# Altium footprint library SMT.PcbLib: 379 footprints (part 1 of 24)
Each footprint in its own frame and in the unit in brackets; x right, y up, seen from the top. Pads: shape width x height; smd on the part's side, far side on the other; paste and mask are expansions set on the pad; w line width, h text height; cw(c..) or ccw(c..) is an arc to the next point about the centre after c.
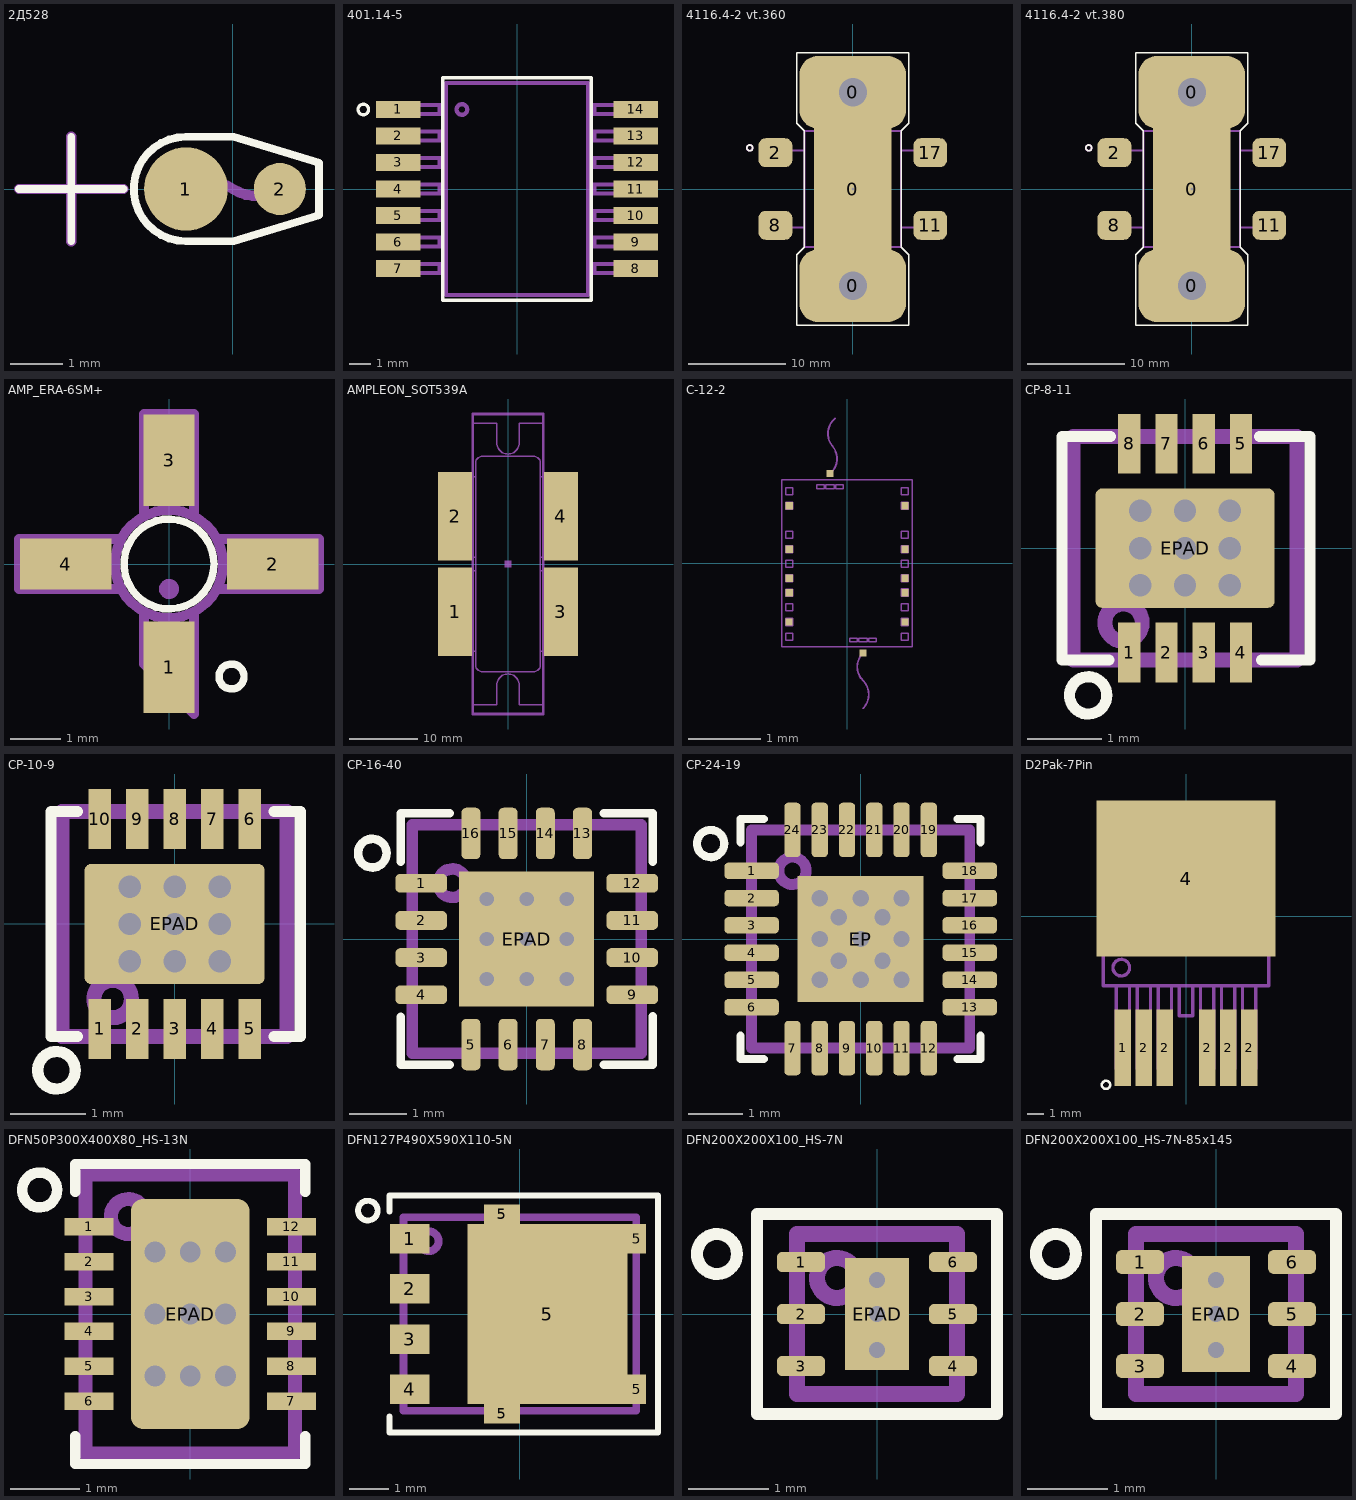
[diagram p0: the footprints below, top view; thin cyan lines are the x and y axes]

## 2Д528 [mm] "Диод кремниевый эпитально-планарный в металлокерамическом корпусе с жесткими выводами"
height 1.2
pads (2):
  round 1.6 smd: 1(-0.9,0)
  round 1 smd: 2(0.9,0)
Top Overlay:
  lines w0.15: -4.1,0 -2.1,0 ; -3.1,-1 -3.1,1 ; -0.9,-1 cw(c-0.9,0) -0.9,1 0.01,1 1.65,0.5 1.65,-0.5 0.01,-1 -0.9,-1
Mechanical 1:
  circle w0.2: c0.9,0 r0.15
  lines w0.2: -4.1,0 -2.1,0 ; -3.1,-1 -3.1,1 ; -0.898,0 cw(c-0.448,-0.7) 0.001,0 ccw(c0.451,0.7) 0.9,0
3D body "Диод 2Д528 _ аА0.339.207 ТУ.stp": height 1.58, standoff 0, extent -1.547,-0.649 0.998,0.649

## 401.14-5 [mm] "Установка по ГОСТ 29137 вариант 381.18.1102.12.00"
height 2.7
pads (14):
  rect 2.1x0.8 smd: 1(-5.6,3.75) 2(-5.6,2.5) 3(-5.6,1.25) 4(-5.6,0) 5(-5.6,-1.25) 6(-5.6,-2.5) 7(-5.6,-3.75) 8(5.6,-3.75) 9(5.6,-2.5) 10(5.6,-1.25) 11(5.6,0) 12(5.6,1.25) 13(5.6,2.5) 14(5.6,3.75)
Top Overlay:
  circle w0.15: c-7.25,3.75 r0.25
  lines w0.15: -3.5,-5.25 -3.5,5.25 3.5,5.25 3.5,-5.25 -3.5,-5.25
Mechanical 1:
  drawing of 187 lines, arcs and shapes, not listed
3D body "Микросхема 533ЛА13 бК0.347.141-35ТУ_02.stp": height 2.68, standoff 0.01, extent -6.5,-5 6.5,5

## 4116.4-2 vt.360 [mm] "Установка по ГОСТ 29137-91 вариант 360"
height 3.1
pads (7):
  rrect50% 11x7.5 / inner round 5 / far side round 5 hole 2.9 paste-25.4: 0(0,-10) 0(0,10)
  rect 8x13 hole 0.3 paste-25.4: 0(0,0)
  rrect50% 3.5x3 smd: 2(-8,3.75) 8(-8,-3.75) 11(8,-3.75) 17(8,3.75)
Top Overlay:
  circle w0.15: c-10.65,4.25 r0.3
  lines w0.15: -5.8,-14.1 -5.8,-6.8 -5,-6 -5,6 -5.8,6.8 -5.8,14.1 5.8,14.1 5.8,6.8 5,6 5,-6 5.8,-6.8 5.8,-14.1 -5.8,-14.1
Mechanical 1:
  circle w0.2: c-10.65,4.25 r0.3
  circle w0.2: c-2.7,4 r0.3
  circle w0.2: c0,-10 r1.5
  circle w0.2: c0,10 r1.5
  lines w0.2: -9,-4 -5,-4 ; -9,4 -5,4 ; 5,-4 9,-4 ; 5,4 9,4 ; -5,-6 -5,6 5,6 5,-6 -5,-6 ; -4.5,-12.5 -4.5,-7 -4.1,-7 ccw(c-4.1,-6.4) -3.5,-6.4 -3.5,6.4 ccw(c-4.1,6.4) -4.1,7 -4.5,7 -4.5,12.5 4.5,12.5 4.5,7 4.1,7 ccw(c4.1,6.4) 3.5,6.4 3.5,-6.4 ccw(c4.1,-6.4) 4.1,-7 4.5,-7 4.5,-12.5 -4.5,-12.5
3D body "Микросхема 142ЕН5(8,9)(А-Г) бК0.347.098 ТУ3.stp": height 3.1, standoff 0, extent -9,-12.5 9,12.5

## 4116.4-2 vt.380 [mm] "Установка по ГОСТ 29137-91 вариант 380"
height 7.1
pads (7):
  rrect50% 11x7.5 / inner round 5 / far side round 5 hole 2.9 paste-25.4: 0(0,-10) 0(0,10)
  rect 8x13 hole 0.3 paste-25.4: 0(0,0)
  rrect50% 3.5x3 smd: 2(-8,3.75) 8(-8,-3.75) 11(8,-3.75) 17(8,3.75)
Top Overlay:
  circle w0.15: c-10.65,4.25 r0.3
  lines w0.15: -5.8,-14.1 5.8,-14.1 5.8,-6.8 5,-6 5,6 5.8,6.8 5.8,14.1 -5.8,14.1 -5.8,6.8 -5,6 -5,-6 -5.8,-6.8 -5.8,-14.1
Mechanical 1:
  circle w0.2: c0,10 r1.5
  circle w0.2: c0,-10 r1.5
  circle w0.2: c-2.7,4 r0.3
  circle w0.2: c-10.65,4.25 r0.3
  lines w0.2: -9,-4 -5,-4 ; -9,4 -5,4 ; 5,-4 9,-4 ; 5,4 9,4 ; -5,-6 5,-6 5,6 -5,6 -5,-6 ; -4.5,-12.5 4.5,-12.5 4.5,-7 4.1,-7 cw(c4.1,-6.4) 3.5,-6.4 3.5,6.4 cw(c4.1,6.4) 4.1,7 4.5,7 4.5,12.5 -4.5,12.5 -4.5,7 -4.1,7 cw(c-4.1,6.4) -3.5,6.4 -3.5,-6.4 cw(c-4.1,-6.4) -4.1,-7 -4.5,-7 -4.5,-12.5
3D body "Микросхема 142ЕН5(8,9)(А-Г) бК0.347.098 ТУ3_radiator.stp": height 7.11, standoff 0.01, extent -9,-12.5 9,12.5

## AMP_ERA-6SM+ [mm] "WW107_4-Leads, Body dia 2,16mm"
height 1.52
pads (4):
  rect 1.02x1.83 smd: 1(0,-2.07) 3(0,2.07)
  rect 1.83x1.02 smd: 2(2.07,0) 4(-2.07,0)
Top Overlay:
  circle w0.15: c1.25,-2.25 r0.25
  circle w0.15: c0,0 r0.9
Mechanical 1:
  circle w0.2: c0,-0.5 r0.1
  circle w0.2: c0,0 r1.08
  lines w0.2: -1,-0.5 -3,-0.5 -3,0.5 -1,0.5 ; -0.5,-1 -0.5,-2 0.5,-3 0.5,-1 ; -0.5,1 -0.5,3 0.5,3 0.5,1 ; 1,-0.5 3,-0.5 3,0.5 1,0.5
3D body "Case Style WW107 (Mini-Circuits).stp": height 1.54, standoff 0.02, extent -2.34,-2.54 2.34,2.34

## AMPLEON_SOT539A [mm] "Flanged balanced ceramic package; 2 mounting holes; 4 leads"
height 2.69
pads (5):
  rect 5x13 smd paste-10 mask+0.05: 1(-7.75,-7) 2(-7.75,7) 3(7.75,-7) 4(7.75,7)
  rect 1x1 on Mech1: 5(0,0)
Mechanical 1:
  lines w0.2: -5.145,-12.765 -5.145,-20.64 -1.65,-20.64 -1.65,-17.78 cw(c0,-17.78) 1.65,-17.78 1.65,-20.64 5.145,-20.64 5.145,-12.765 ; -5.145,-0.955 -5.145,0.955 ; -5.145,12.765 -5.145,20.64 -1.65,20.64 -1.65,17.78 ccw(c0,17.78) 1.65,17.78 1.65,20.64 5.145,20.64 5.145,12.765 ; -4.75,-12.765 -7.56,-12.765 -8.56,-11.765 -8.56,-0.955 -4.75,-0.955 ; -4.75,0.955 -7.56,0.955 -8.56,1.955 -8.56,12.765 -4.75,12.765 ; 4.75,-12.765 8.56,-12.765 8.56,-0.955 4.75,-0.955 ; 4.75,0.955 8.56,0.955 8.56,12.765 4.75,12.765 ; 5.145,-0.955 5.145,0.955 ; -4.75,-14.8 ccw(c-3.75,-14.8) -3.75,-15.8 3.75,-15.8 ccw(c3.75,-14.8) 4.75,-14.8 4.75,14.8 ccw(c3.75,14.8) 3.75,15.8 -3.75,15.8 ccw(c-3.75,14.8) -4.75,14.8 -4.75,-14.8
Mechanical 2:
  lines w0.4: -5.15,-22 5.15,-22 5.15,22 -5.15,22 -5.15,-22
Mechanical 20:
  text "5 вывод показан условно, /  крепится к теплоотводу. / Рекомендованное расстояние между  / крепежом  M3  (38.6 mm)." at 2.8,-11.3 h1.52
3D body "BLF989.stp": height 2.31, standoff -2.07, extent -8.56,-20.64 8.56,20.64

## C-12-2 [mm] "12-pad bare die; 2.3x1.8x0.051 mm"
height 0.051
pads (12):
  rect 0.099x0.099 smd mask+0.005: 1(0.22,-1.238) 2(-0.799,-0.809) 3(-0.797,-0.405) 4(-0.797,-0.206) 5(-0.797,0.194) 6(-0.797,0.794) 7(-0.235,1.238) 8(0.798,0.794) 9(0.797,0.194) 10(0.798,-0.206) 11(0.798,-0.405) 12(0.799,-0.809)
Top Solder:
  region: 0.938,1.084 0.97,1.103 0.98,1.177 0.927,1.23 0.852,1.22 0.834,1.188 -0.835,1.188 -0.853,1.22 -0.928,1.23 -0.981,1.177 -0.971,1.103 -0.938,1.084 -0.938,-1.084 -0.971,-1.103 -0.981,-1.177 -0.928,-1.23 -0.853,-1.22 -0.835,-1.188 0.834,-1.188 0.852,-1.22 0.927,-1.23 0.98,-1.177 0.97,-1.103 0.938,-1.084
Mechanical 1:
  lines w0.025: -0.235,1.237 ccw(c-0.408,1.444) -0.201,1.617 cw(c0.005,1.79) -0.168,1.997 ; 0.22,-2 ccw(c0.03,-1.809) 0.22,-1.619 cw(c0.411,-1.428) 0.22,-1.238
Top Assembly:
  lines w0.01: -0.847,-0.454 -0.748,-0.355 ; -0.847,-0.355 -0.748,-0.454 ; 0.748,0.145 0.847,0.243 ; 0.748,0.243 0.847,0.144
  lines w0.02: -0.9,-1.15 0.899,-1.15 ; -0.9,-1.15 -0.901,1.15 ; -0.9,-1.15 0.9,-1.15 ; -0.9,-1.15 -0.9,1.15 ; -0.901,1.15 0.899,1.15 ; -0.9,1.15 0.9,1.15 ; 0.899,-1.15 0.899,1.15 ; 0.9,-1.15 0.9,1.15 ; -0.847,-1.064 -0.748,-1.064 -0.748,-0.966 -0.847,-0.965 -0.847,-1.064 ; -0.847,-0.862 -0.748,-0.862 -0.748,-0.755 -0.847,-0.755 -0.847,-0.862 ; -0.847,-0.655 -0.748,-0.655 -0.748,-0.557 -0.847,-0.556 -0.847,-0.655 ; -0.847,-0.454 -0.748,-0.454 -0.748,-0.355 -0.847,-0.355 -0.847,-0.454 ; -0.847,-0.256 -0.748,-0.255 -0.748,-0.157 -0.847,-0.157 -0.847,-0.256 ; -0.847,-0.054 -0.748,-0.054 -0.748,0.045 -0.847,0.044 -0.847,-0.054 ; -0.847,0.144 -0.748,0.145 -0.748,0.244 -0.847,0.243 -0.847,0.144 ; -0.847,0.345 -0.748,0.345 -0.748,0.444 -0.847,0.443 -0.847,0.345 ; -0.847,0.744 -0.748,0.744 -0.748,0.844 -0.847,0.843 -0.847,0.744 ; -0.847,0.945 -0.748,0.944 -0.748,1.044 -0.847,1.044 -0.847,0.945 ; -0.414,1.031 -0.314,1.031 -0.314,1.083 -0.415,1.084 -0.414,1.031 ; -0.294,1.031 -0.175,1.03 -0.175,1.084 -0.294,1.084 -0.294,1.031 ; -0.154,1.031 -0.054,1.031 -0.054,1.084 -0.154,1.084 -0.154,1.031 ; 0.041,-1.084 0.141,-1.084 0.141,-1.03 0.04,-1.03 0.041,-1.084 ; 0.161,-1.083 0.28,-1.083 0.28,-1.031 0.161,-1.031 0.161,-1.083 ; 0.301,-1.084 0.401,-1.083 0.401,-1.03 0.301,-1.03 0.301,-1.084 ; 0.748,-1.065 0.847,-1.064 0.847,-0.965 0.748,-0.966 0.748,-1.065 ; 0.748,-0.862 0.847,-0.862 0.847,-0.756 0.748,-0.755 0.748,-0.862 ; 0.748,-0.655 0.847,-0.655 0.847,-0.556 0.748,-0.556 0.748,-0.655 ; 0.748,-0.456 0.847,-0.456 0.847,-0.354 0.748,-0.354 0.748,-0.456 ; 0.748,-0.255 0.847,-0.255 0.847,-0.157 0.748,-0.156 0.748,-0.255 ; 0.748,-0.054 0.847,-0.054 0.847,0.044 0.748,0.045 0.748,-0.054 ; 0.748,0.145 0.847,0.144 0.847,0.243 0.748,0.243 0.748,0.145 ; 0.748,0.345 0.847,0.344 0.847,0.444 0.748,0.444 0.748,0.345 ; 0.748,0.745 0.847,0.745 0.847,0.844 0.748,0.844 0.748,0.745 ; 0.748,0.944 0.847,0.944 0.847,1.044 0.748,1.044 0.748,0.944
  text "2" at -0.651,-0.825 h0.1
  text "3" at -0.65,-0.425 h0.1
  text "4" at -0.65,-0.225 h0.1
  text "1" at 0.25,-0.975 h0.1
  text "12" at 0.7,-0.85 h0.1
  text "11" at 0.7,-0.425 h0.1
  text "10" at 0.7,-0.25 h0.1
  text "9" at 0.7,0.15 h0.1
  text "8" at 0.7,0.775 h0.1
  text "7" at -0.2,0.925 h0.1
  text "6" at -0.65,0.775 h0.1
  text "5" at -0.65,0.175 h0.1
Mechanical 20:
  text "См.  /  /  /  / datasheet" at -2.1,-2.605 h1.5
3D body "HMC1144.stp": height -0.3, standoff -0.35, extent -0.901,-1.15 0.899,1.15

## CP-8-11 [mm] "8-Lead Lead Frame Chip Scale Package [LFCSP_WD]   3 mmx3 mm Body, Very Very Thin, Dual Lead"
height 0.8
pads (9):
  rect 0.3x0.8 smd mask+0.03: 1(-0.75,-1.4) 2(-0.25,-1.4) 3(0.25,-1.4) 4(0.75,-1.4) 5(0.75,1.4) 6(0.25,1.4) 7(-0.25,1.4) 8(-0.75,1.4)
  rrect10% 2.4x1.6 hole 0.3 mask+0.05: EPAD(0,0)
via 0.6,-0.5 diameter 0.6 hole 0.3
via 0.6,0 diameter 0.6 hole 0.3
via 0.6,0.5 diameter 0.6 hole 0.3
via -0.6,0.5 diameter 0.6 hole 0.3
via -0.6,0 diameter 0.6 hole 0.3
via -0.6,-0.5 diameter 0.6 hole 0.3
via 0,-0.5 diameter 0.6 hole 0.3
via 0,0.5 diameter 0.6 hole 0.3
Top Overlay:
  circle w0.15: c-1.3,-1.975 r0.25
  lines w0.15: -1.025,-1.5 -1.65,-1.5 -1.65,1.25 -1.65,1.5 -1,1.5 ; 1,1.5 1.675,1.5 1.675,1.375 1.675,-1.5 1.025,-1.5
Top Paste:
  rectangle: -0.6,-0.5 0.6,0.5
Mechanical 1:
  circle w0.2: c-0.825,-1 r0.25
  lines w0.2: -1.5,-1.5 -1.5,1.5 1.5,1.5 1.5,-1.5 -1.5,-1.5
3D body "LFCSP8-3X3.stp": height 0.88, standoff 0.01, extent -1.5,-1.501 1.5,1.501

## CP-10-9 [mm] "8-10-Lead Lead Frame Chip Scale Package [LFCSP]   3 mmx3 mm Body and 0.75 mm Package Height"
height 0.8
pads (11):
  rect 0.3x0.8 smd mask+0.03: 1(-1,-1.4) 2(-0.5,-1.4) 3(0,-1.4) 4(0.5,-1.4) 5(1,-1.4) 6(1,1.4) 7(0.5,1.4) 8(0,1.4) 9(-0.5,1.4) 10(-1,1.4)
  rrect10% 2.4x1.6 hole 0.3 mask+0.05: EPAD(0,0)
via 0,0.5 diameter 0.6 hole 0.3
via 0,-0.5 diameter 0.6 hole 0.3
via -0.6,-0.5 diameter 0.6 hole 0.3
via -0.6,0 diameter 0.6 hole 0.3
via -0.6,0.5 diameter 0.6 hole 0.3
via 0.6,0.5 diameter 0.6 hole 0.3
via 0.6,0 diameter 0.6 hole 0.3
via 0.6,-0.5 diameter 0.6 hole 0.3
Top Overlay:
  circle w0.15: c-1.575,-1.95 r0.25
  lines w0.15: -1.3,-1.5 -1.65,-1.5 -1.65,1.25 -1.65,1.5 -1.3,1.5 ; 1.325,-1.5 1.675,-1.5 1.675,1.375 1.675,1.5 1.325,1.5
Top Paste:
  rectangle: -1,-0.625 1,0.65
Mechanical 1:
  circle w0.2: c-0.825,-1 r0.25
  lines w0.2: -1.5,-1.5 1.5,-1.5 1.5,1.5 -1.5,1.5 -1.5,-1.5
3D body "LFCSP_WD-10.stp": height 0.81, standoff 0.01, extent -1.5,-1.55 1.5,1.55

## CP-16-40 [mm] "QFN, Body:4,00x4,00x1,00mm, Thermal Pad:2,4x2,4mm, 16-Leads, Pitch 0,65mm"
height 1
pads (17):
  rrect50% 0.9x0.33 smd mask+0.05: 1(-1.845,0.975) 2(-1.845,0.325) 3(-1.845,-0.325) 4(-1.845,-0.975) 9(1.845,-0.975) 10(1.845,-0.325) 11(1.845,0.325) 12(1.845,0.975)
  rrect50% 0.33x0.9 smd mask+0.05: 5(-0.975,-1.845) 6(-0.325,-1.845) 7(0.325,-1.845) 8(0.975,-1.845) 13(0.975,1.845) 14(0.325,1.845) 15(-0.325,1.845) 16(-0.975,1.845)
  rect 2.36x2.36 hole 0.25 mask+0.05: EPAD(0,0)
via 0,0.7 diameter 0.6 hole 0.25
via 0,-0.7 diameter 0.6 hole 0.25
via 0.7,-0.7 diameter 0.6 hole 0.25
via 0.7,0.7 diameter 0.6 hole 0.25
via -0.7,-0.7 diameter 0.6 hole 0.25
via -0.7,0.7 diameter 0.6 hole 0.25
via 0.7,0 diameter 0.6 hole 0.25
via -0.7,0 diameter 0.6 hole 0.25
Top Overlay:
  circle w0.15: c-2.7,1.5 r0.25
  lines w0.15: -2.2,-1.36 -2.2,-2.2 -1.35,-2.2 ; -2.2,1.35 -2.2,2.2 -1.35,2.2 ; 1.35,-2.2 2.2,-2.2 2.2,-1.35 ; 1.35,2.2 2.2,2.2 2.2,1.35
Top Paste:
  region: -0.95,0.95 0.95,0.95 0.95,-0.95 -0.95,-0.95
Mechanical 1:
  circle w0.2: c-1.3,0.975 r0.25
  lines w0.2: -2,-2 2,-2 2,2 -2,2 -2,-2
3D body "Микросхема HMC8038.stp": height 0.98, standoff -0.02, extent -2.022,-2.02 2.023,2.02

## CP-24-19 [mm] "QFN, 24-Leads, Body 4,00x4,00mm, Pitch 0,50mm, Thermal Pad 2,10x2,10mm, IPC Medium Density"
height 0.8
pads (25):
  rrect50% 1x0.3 smd mask+0.05: 1(-2,1.25) 2(-2,0.75) 3(-2,0.25) 4(-2,-0.25) 5(-2,-0.75) 6(-2,-1.25) 13(2,-1.25) 14(2,-0.75) 15(2,-0.25) 16(2,0.25) 17(2,0.75) 18(2,1.25)
  rrect50% 0.3x1 smd mask+0.05: 7(-1.25,-2) 8(-0.75,-2) 9(-0.25,-2) 10(0.25,-2) 11(0.75,-2) 12(1.25,-2) 19(1.25,2) 20(0.75,2) 21(0.25,2) 22(-0.25,2) 23(-0.75,2) 24(-1.25,2)
  rect 2.31x2.31 hole 0.3 mask+0.05: EP(0,0)
via 0.4,0.4 diameter 0.6 hole 0.3
via 0,0.75 diameter 0.6 hole 0.3
via 0.75,0.75 diameter 0.6 hole 0.3
via -0.75,0.75 diameter 0.6 hole 0.3
via -0.75,0 diameter 0.6 hole 0.3
via -0.75,-0.75 diameter 0.6 hole 0.3
via 0.75,-0.75 diameter 0.6 hole 0.3
via 0,-0.75 diameter 0.6 hole 0.3
via 0,0 diameter 0.6 hole 0.3
via 0.4,-0.4 diameter 0.6 hole 0.3
via 0.75,0 diameter 0.6 hole 0.3
via -0.4,-0.4 diameter 0.6 hole 0.3
via -0.4,0.4 diameter 0.6 hole 0.3
Top Overlay:
  circle w0.15: c-2.75,1.75 r0.25
  lines w0.15: -2.2,-1.775 -2.2,-2.2 -1.775,-2.2 ; -2.2,1.775 -2.2,2.2 -1.775,2.2 ; 1.775,-2.2 2.2,-2.2 2.2,-1.775 ; 1.775,2.2 2.2,2.2 2.2,1.775
Mechanical 1:
  circle w0.2: c-1.25,1.25 r0.25
  lines w0.2: -2,-2 -2,2 2,2 2,-2 -2,-2
Mechanical 15:
  lines w0.1: -0.5,0 0.5,0 ; 0,-0.5 0,0.5
3D body "CP-24-19.step": height 0.8, standoff 0, extent -2.07,-2.07 2.07,2.07

## D2Pak-7Pin [mm] "D2Pak-7Pin (TO-263)"
height 4.83
pads (7):
  rect 1x4.6 smd paste-0.1 mask+0.05: 1(-3.81,-7.916) 2(-2.54,-7.916) 2(-1.27,-7.916) 2(1.27,-7.916) 2(2.54,-7.916) 2(3.81,-7.916)
  rect 10.8x9.4 smd paste-15: 4(0,2.286)
Top Overlay:
  circle w0.15: c-4.826,-10.16 r0.25
Top Paste:
  region: -0.5,-0.964 -0.5,1.786 -3.25,1.786 -3.25,-0.964
  region: -3.25,5.536 -3.25,2.786 -0.5,2.786 -0.5,5.536
  region: 0.5,5.536 0.5,2.786 3.25,2.786 3.25,5.536
  region: 3.25,-0.964 3.25,1.786 0.5,1.786 0.5,-0.964
Mechanical 1:
  circle w0.2: c-3.904,-3.092 r0.5
  lines w0.2: -4.21,-4.191 -4.21,-9.181 -3.41,-9.181 -3.41,-4.191 ; -2.94,-4.191 -2.94,-9.181 -2.14,-9.181 -2.14,-4.191 ; -1.67,-4.191 -1.67,-9.181 -0.87,-9.181 -0.87,-4.191 ; -0.4,-4.191 -0.4,-5.991 0.4,-5.991 0.4,-4.191 ; 0.87,-4.191 0.87,-9.181 1.67,-9.181 1.67,-4.191 ; 2.14,-4.191 2.14,-9.181 2.94,-9.181 2.94,-4.191 ; 3.41,-4.191 3.41,-9.181 4.21,-9.181 4.21,-4.191 ; -5,-4.191 -5,4.809 ; -5,-4.191 -5,4.419 ; -5,-4.191 5,-4.191 5,4.419 ; -5,4.419 5,4.419 ; -5,4.419 -5,4.809 ; -5,4.809 -5,5.649 -3.11,6.489 3.11,6.489 5,5.649 5,4.809 5,4.419
3D body "User Library-TO263-7S.STEP": height 4.81, standoff 0.01, extent -5,-9.816 5,5.854

## DFN50P300X400X80_HS-13N [mm] "DFN, 12-Leads, Body 3,00x4,00mm, Pitch 0,50mm, Thermal Pad 1,70x3,30mm, IPC Medium Density"
height 0.8
pads (13):
  rect 0.7x0.25 smd mask+0.05: 1(-1.45,1.25) 2(-1.45,0.75) 3(-1.45,0.25) 4(-1.45,-0.25) 5(-1.45,-0.75) 6(-1.45,-1.25) 7(1.45,-1.25) 8(1.45,-0.75) 9(1.45,-0.25) 10(1.45,0.25) 11(1.45,0.75) 12(1.45,1.25)
  rrect20% 1.7x3.3 hole 0.3 mask+0.05: EPAD(0,0)
via -0.508,0 diameter 0.6 hole 0.3
via 0.508,0 diameter 0.6 hole 0.3
via 0.508,0.889 diameter 0.6 hole 0.3
via 0,0.889 diameter 0.6 hole 0.3
via -0.508,0.889 diameter 0.6 hole 0.3
via -0.508,-0.889 diameter 0.6 hole 0.3
via 0,-0.889 diameter 0.6 hole 0.3
via 0.508,-0.889 diameter 0.6 hole 0.3
Top Overlay:
  circle w0.15: c-2.159,1.778 r0.25
  lines w0.15: -1.65,-1.75 -1.65,-2.15 1.651,-2.15 ; -1.65,1.75 -1.65,2.15 1.651,2.15 ; 1.65,-2.15 1.65,-1.75 ; 1.65,1.75 1.65,2.15
Top Paste:
  rectangle: -0.7,-1.3 0.7,1.3
Mechanical 1:
  circle w0.2: c-0.889,1.397 r0.25
  lines w0.2: -1.5,-2 -1.5,2 1.5,2 1.5,-2 -1.5,-2
3D body "DFN50P300X400X80_HS-13N.step": height 0.8, standoff 0, extent -1.501,-2 1.501,2

## DFN127P490X590X110-5N [mm] "DFN5 (SO-8FL ,case 488AA), Body 5x6 mm, Pitch 1.27 mm."
height 1.1
pads (9):
  rect 1x0.75 smd paste+0 mask+0.05: 1(-2.795,1.905) 2(-2.795,0.635) 3(-2.795,-0.635) 4(-2.795,-1.905)
  rect 0.905x0.495 smd mask+0.05: 5(-0.452,-2.528) 5(-0.452,2.528)
  rect 4.055x4.56 smd paste-10 mask+0.05: 5(0.698,0)
  rect 0.475x0.75 smd mask+0.05: 5(2.963,-1.905) 5(2.963,1.905)
Top Overlay:
  circle w0.15: c-3.85,2.62 r0.25
  lines w0.15: -3.3,-2.6 -3.3,-3 3.5,-3 3.5,3 -3.3,3 -3.3,2.6
Top Paste:
  rectangle: 0.965,-2.13 2.465,-0.26
  rectangle: 0.965,0.26 2.465,2.13
  rectangle: -1.075,-2.12 0.425,-0.25
  rectangle: -1.075,0.25 0.425,2.12
Mechanical 1:
  circle w0.2: c-2.31,1.845 r0.25
  lines w0.2: -2.95,-2.45 2.95,-2.45 2.95,2.45 -2.95,2.45 -2.95,-2.45
3D body "DFN5x6_SO8FL.stp": height 1.13, standoff 0, extent -3.1,-2.58 3.05,2.57

## DFN200X200X100_HS-7N [mm] "DFN, 6-Leads, Body 2,00x2,00mm, Pitch 0,65mm, Thermal Pad 0,80x1,40mm, IPC Medium Density"
height 1
pads (7):
  rrect50% 0.6x0.25 smd mask+0.05: 1(-0.95,0.65) 2(-0.95,0) 3(-0.95,-0.65) 4(0.95,-0.65) 5(0.95,0) 6(0.95,0.65)
  rect 0.8x1.4 hole 0.2 mask+0.05: EPAD(0,0)
via 0,0.425 diameter 0.5 hole 0.2
via 0,-0.45 diameter 0.5 hole 0.2
Top Overlay:
  circle w0.15: c-2,0.75 r0.25
  lines w0.15: -1.5,-1.25 -1.5,1.25 1.5,1.25 1.5,-1.25 -1.5,-1.25
Top Paste:
  rectangle: -0.35,-0.65 0.35,0.65
Mechanical 1:
  circle w0.2: c-0.5,0.45 r0.25
  lines w0.2: -1,-1 -1,1 1,1 1,-1 -1,-1
3D body "DFN-6_0.65p.stp": height 1.06, standoff 0.01, extent -1,-1 1,1

## DFN200X200X100_HS-7N-85x145 [mm] "DFN, 6-Leads, Body 2,00x2,00mm, Pitch 0,65mm, Thermal Pad 0,80x1,40mm, IPC Medium Density"
height 1
pads (7):
  rrect50% 0.6x0.3 smd paste+0 mask+0.05: 1(-0.95,0.65) 2(-0.95,0) 3(-0.95,-0.65) 4(0.95,-0.65) 5(0.95,0) 6(0.95,0.65)
  rect 0.85x1.45 hole 0.2 mask+0.05: EPAD(0,0)
via 0,-0.45 diameter 0.5 hole 0.2
via 0,0.425 diameter 0.5 hole 0.2
Top Overlay:
  circle w0.15: c-2,0.75 r0.25
  lines w0.15: -1.5,-1.25 1.5,-1.25 1.5,1.25 -1.5,1.25 -1.5,-1.25
Top Paste:
  rectangle: -0.35,-0.65 0.35,0.65
Mechanical 1:
  circle w0.2: c-0.5,0.45 r0.25
  lines w0.2: -1,-1 1,-1 1,1 -1,1 -1,-1
3D body "DFN-6_0.65p.stp": height 1.06, standoff 0.01, extent -1,-1 1,1